# Altium footprint library ST封装.PcbLib: 1336 footprints (part 83 of 109) (continued)
## SQFP20X28-184(T) [mm]
pads (184):
  rect 0.4x1.6 smd: 1(0,0)
  oval 0.4x1.6 smd: 2(-0.5,0) 3(-1,0) 4(-1.5,0) 5(-2,0) 6(-2.5,0) 7(-3,0) 8(-3.5,0) 9(-4,0) 10(-4.5,0) 11(-5,0) 12(-5.5,0) 13(-6,0) 14(-6.5,0) 15(-7,0) 16(-7.5,0) 17(-8,0) 18(-8.5,0) 19(-9,0) 74(-9,-29.4) 75(-8.5,-29.4) 76(-8,-29.4) 77(-7.5,-29.4) 78(-7,-29.4) 79(-6.5,-29.4) 80(-6,-29.4) 81(-5.5,-29.4) 82(-5,-29.4) 83(-4.5,-29.4) 84(-4,-29.4) 85(-3.5,-29.4) 86(-3,-29.4) 87(-2.5,-29.4) 88(-2,-29.4) 89(-1.5,-29.4) 90(-1,-29.4) 91(-0.5,-29.4) 92(0,-29.4) 93(0.5,-29.4) 94(1,-29.4) 95(1.5,-29.4) 96(2,-29.4) 97(2.5,-29.4) 98(3,-29.4) 99(3.5,-29.4) 100(4,-29.4) 101(4.5,-29.4) 102(5,-29.4) 103(5.5,-29.4) 104(6,-29.4) 105(6.5,-29.4) 106(7,-29.4) 107(7.5,-29.4) 108(8,-29.4) 109(8.5,-29.4) 110(9,-29.4) 111(9.5,-29.4) 166(9.5,0) 167(9,0) 168(8.5,0) 169(8,0) 170(7.5,0) 171(7,0) 172(6.5,0) 173(6,0) 174(5.5,0) 175(5,0) 176(4.5,0) 177(4,0) 178(3.5,0) 179(3,0) 180(2.5,0) 181(2,0) 182(1.5,0) 183(1,0) 184(0.5,0)
  oval 1.6x0.4 smd: 20(-10.45,-1.45) 21(-10.45,-1.95) 22(-10.45,-2.45) 23(-10.45,-2.95) 24(-10.45,-3.45) 25(-10.45,-3.95) 26(-10.45,-4.45) 27(-10.45,-4.95) 28(-10.45,-5.45) 29(-10.45,-5.95) 30(-10.45,-6.45) 31(-10.45,-6.95) 32(-10.45,-7.45) 33(-10.45,-7.95) 34(-10.45,-8.45) 35(-10.45,-8.95) 36(-10.45,-9.45) 37(-10.45,-9.95) 38(-10.45,-10.45) 39(-10.45,-10.95) 40(-10.45,-11.45) 41(-10.45,-11.95) 42(-10.45,-12.45) 43(-10.45,-12.95) 44(-10.45,-13.45) 45(-10.45,-13.95) 46(-10.45,-14.45) 47(-10.45,-14.95) 48(-10.45,-15.45) 49(-10.45,-15.95) 50(-10.45,-16.45) 51(-10.45,-16.95) 52(-10.45,-17.45) 53(-10.45,-17.95) 54(-10.45,-18.45) 55(-10.45,-18.95) 56(-10.45,-19.45) 57(-10.45,-19.95) 58(-10.45,-20.45) 59(-10.45,-20.95) 60(-10.45,-21.45) 61(-10.45,-21.95) 62(-10.45,-22.45) 63(-10.45,-22.95) 64(-10.45,-23.45) 65(-10.45,-23.95) 66(-10.45,-24.45) 67(-10.45,-24.95) 68(-10.45,-25.45) 69(-10.45,-25.95) 70(-10.45,-26.45) 71(-10.45,-26.95) 72(-10.45,-27.45) 73(-10.45,-27.95) 112(10.95,-27.95) 113(10.95,-27.45) 114(10.95,-26.95) 115(10.95,-26.45) 116(10.95,-25.95) 117(10.95,-25.45) 118(10.95,-24.95) 119(10.95,-24.45) 120(10.95,-23.95) 121(10.95,-23.45) 122(10.95,-22.95) 123(10.95,-22.45) 124(10.95,-21.95) 125(10.95,-21.45) 126(10.95,-20.95) 127(10.95,-20.45) 128(10.95,-19.95) 129(10.95,-19.45) 130(10.95,-18.95) 131(10.95,-18.45) 132(10.95,-17.95) 133(10.95,-17.45) 134(10.95,-16.95) 135(10.95,-16.45) 136(10.95,-15.95) 137(10.95,-15.45) 138(10.95,-14.95) 139(10.95,-14.45) 140(10.95,-13.95) 141(10.95,-13.45) 142(10.95,-12.95) 143(10.95,-12.45) 144(10.95,-11.95) 145(10.95,-11.45) 146(10.95,-10.95) 147(10.95,-10.45) 148(10.95,-9.95) 149(10.95,-9.45) 150(10.95,-8.95) 151(10.95,-8.45) 152(10.95,-7.95) 153(10.95,-7.45) 154(10.95,-6.95) 155(10.95,-6.45) 156(10.95,-5.95) 157(10.95,-5.45) 158(10.95,-4.95) 159(10.95,-4.45) 160(10.95,-3.95) 161(10.95,-3.45) 162(10.95,-2.95) 163(10.95,-2.45) 164(10.95,-1.95) 165(10.95,-1.45)
Top Overlay:
  lines w0.2: -10.85,-28.65 -10.85,-29.8 -9.7,-29.8 ; -10.85,-0.75 -10.85,-0.4 -10.05,0.4 -9.7,0.4 ; 10.2,-29.8 11.35,-29.8 11.35,-28.65 ; 10.2,0.4 11.35,0.4 11.35,-0.75

## SQFP20X28-224(N) [mm]
pads (224):
  rect 1.6x0.3 smd: 1(0,0)
  oval 1.6x0.3 smd: 2(0,-0.4) 3(0,-0.8) 4(0,-1.2) 5(0,-1.6) 6(0,-2) 7(0,-2.4) 8(0,-2.8) 9(0,-3.2) 10(0,-3.6) 11(0,-4) 12(0,-4.4) 13(0,-4.8) 14(0,-5.2) 15(0,-5.6) 16(0,-6) 17(0,-6.4) 18(0,-6.8) 19(0,-7.2) 20(0,-7.6) 21(0,-8) 22(0,-8.4) 23(0,-8.8) 24(0,-9.2) 25(0,-9.6) 26(0,-10) 27(0,-10.4) 28(0,-10.8) 29(0,-11.2) 30(0,-11.6) 31(0,-12) 32(0,-12.4) 33(0,-12.8) 34(0,-13.2) 35(0,-13.6) 36(0,-14) 37(0,-14.4) 38(0,-14.8) 39(0,-15.2) 40(0,-15.6) 41(0,-16) 42(0,-16.4) 43(0,-16.8) 44(0,-17.2) 45(0,-17.6) 46(0,-18) 47(0,-18.4) 48(0,-18.8) 49(0,-19.2) 50(0,-19.6) 51(0,-20) 52(0,-20.4) 53(0,-20.8) 54(0,-21.2) 55(0,-21.6) 56(0,-22) 57(0,-22.4) 58(0,-22.8) 59(0,-23.2) 60(0,-23.6) 61(0,-24) 62(0,-24.4) 63(0,-24.8) 64(0,-25.2) 65(0,-25.6) 66(0,-26) 113(21.4,-26) 114(21.4,-25.6) 115(21.4,-25.2) 116(21.4,-24.8) 117(21.4,-24.4) 118(21.4,-24) 119(21.4,-23.6) 120(21.4,-23.2) 121(21.4,-22.8) 122(21.4,-22.4) 123(21.4,-22) 124(21.4,-21.6) 125(21.4,-21.2) 126(21.4,-20.8) 127(21.4,-20.4) 128(21.4,-20) 129(21.4,-19.6) 130(21.4,-19.2) 131(21.4,-18.8) 132(21.4,-18.4) 133(21.4,-18) 134(21.4,-17.6) 135(21.4,-17.2) 136(21.4,-16.8) 137(21.4,-16.4) 138(21.4,-16) 139(21.4,-15.6) 140(21.4,-15.2) 141(21.4,-14.8) 142(21.4,-14.4) 143(21.4,-14) 144(21.4,-13.6) 145(21.4,-13.2) 146(21.4,-12.8) 147(21.4,-12.4) 148(21.4,-12) 149(21.4,-11.6) 150(21.4,-11.2) 151(21.4,-10.8) 152(21.4,-10.4) 153(21.4,-10) 154(21.4,-9.6) 155(21.4,-9.2) 156(21.4,-8.8) 157(21.4,-8.4) 158(21.4,-8) 159(21.4,-7.6) 160(21.4,-7.2) 161(21.4,-6.8) 162(21.4,-6.4) 163(21.4,-6) 164(21.4,-5.6) 165(21.4,-5.2) 166(21.4,-4.8) 167(21.4,-4.4) 168(21.4,-4) 169(21.4,-3.6) 170(21.4,-3.2) 171(21.4,-2.8) 172(21.4,-2.4) 173(21.4,-2) 174(21.4,-1.6) 175(21.4,-1.2) 176(21.4,-0.8) 177(21.4,-0.4) 178(21.4,0)
  oval 0.3x1.6 smd: 67(1.7,-27.7) 68(2.1,-27.7) 69(2.5,-27.7) 70(2.9,-27.7) 71(3.3,-27.7) 72(3.7,-27.7) 73(4.1,-27.7) 74(4.5,-27.7) 75(4.9,-27.7) 76(5.3,-27.7) 77(5.7,-27.7) 78(6.1,-27.7) 79(6.5,-27.7) 80(6.9,-27.7) 81(7.3,-27.7) 82(7.7,-27.7) 83(8.1,-27.7) 84(8.5,-27.7) 85(8.9,-27.7) 86(9.3,-27.7) 87(9.7,-27.7) 88(10.1,-27.7) 89(10.5,-27.7) 90(10.9,-27.7) 91(11.3,-27.7) 92(11.7,-27.7) 93(12.1,-27.7) 94(12.5,-27.7) 95(12.9,-27.7) 96(13.3,-27.7) 97(13.7,-27.7) 98(14.1,-27.7) 99(14.5,-27.7) 100(14.9,-27.7) 101(15.3,-27.7) 102(15.7,-27.7) 103(16.1,-27.7) 104(16.5,-27.7) 105(16.9,-27.7) 106(17.3,-27.7) 107(17.7,-27.7) 108(18.1,-27.7) 109(18.5,-27.7) 110(18.9,-27.7) 111(19.3,-27.7) 112(19.7,-27.7) 179(19.7,1.7) 180(19.3,1.7) 181(18.9,1.7) 182(18.5,1.7) 183(18.1,1.7) 184(17.7,1.7) 185(17.3,1.7) 186(16.9,1.7) 187(16.5,1.7) 188(16.1,1.7) 189(15.7,1.7) 190(15.3,1.7) 191(14.9,1.7) 192(14.5,1.7) 193(14.1,1.7) 194(13.7,1.7) 195(13.3,1.7) 196(12.9,1.7) 197(12.5,1.7) 198(12.1,1.7) 199(11.7,1.7) 200(11.3,1.7) 201(10.9,1.7) 202(10.5,1.7) 203(10.1,1.7) 204(9.7,1.7) 205(9.3,1.7) 206(8.9,1.7) 207(8.5,1.7) 208(8.1,1.7) 209(7.7,1.7) 210(7.3,1.7) 211(6.9,1.7) 212(6.5,1.7) 213(6.1,1.7) 214(5.7,1.7) 215(5.3,1.7) 216(4.9,1.7) 217(4.5,1.7) 218(4.1,1.7) 219(3.7,1.7) 220(3.3,1.7) 221(2.9,1.7) 222(2.5,1.7) 223(2.1,1.7) 224(1.7,1.7)
Top Overlay:
  lines w0.2: -0.4,-26.65 -0.4,-28.1 1.05,-28.1 ; -0.4,0.65 -0.4,1.3 0.4,2.1 1.05,2.1 ; 20.35,-28.1 21.8,-28.1 21.8,-26.65 ; 20.35,2.1 21.8,2.1 21.8,0.65

## SQFP20X28-224(T) [mm]
pads (224):
  rect 0.3x1.6 smd: 1(0,0)
  oval 0.3x1.6 smd: 2(-0.4,0) 3(-0.8,0) 4(-1.2,0) 5(-1.6,0) 6(-2,0) 7(-2.4,0) 8(-2.8,0) 9(-3.2,0) 10(-3.6,0) 11(-4,0) 12(-4.4,0) 13(-4.8,0) 14(-5.2,0) 15(-5.6,0) 16(-6,0) 17(-6.4,0) 18(-6.8,0) 19(-7.2,0) 20(-7.6,0) 21(-8,0) 22(-8.4,0) 23(-8.8,0) 90(-8.8,-29.4) 91(-8.4,-29.4) 92(-8,-29.4) 93(-7.6,-29.4) 94(-7.2,-29.4) 95(-6.8,-29.4) 96(-6.4,-29.4) 97(-6,-29.4) 98(-5.6,-29.4) 99(-5.2,-29.4) 100(-4.8,-29.4) 101(-4.4,-29.4) 102(-4,-29.4) 103(-3.6,-29.4) 104(-3.2,-29.4) 105(-2.8,-29.4) 106(-2.4,-29.4) 107(-2,-29.4) 108(-1.6,-29.4) 109(-1.2,-29.4) 110(-0.8,-29.4) 111(-0.4,-29.4) 112(0,-29.4) 113(0.4,-29.4) 114(0.8,-29.4) 115(1.2,-29.4) 116(1.6,-29.4) 117(2,-29.4) 118(2.4,-29.4) 119(2.8,-29.4) 120(3.2,-29.4) 121(3.6,-29.4) 122(4,-29.4) 123(4.4,-29.4) 124(4.8,-29.4) 125(5.2,-29.4) 126(5.6,-29.4) 127(6,-29.4) 128(6.4,-29.4) 129(6.8,-29.4) 130(7.2,-29.4) 131(7.6,-29.4) 132(8,-29.4) 133(8.4,-29.4) 134(8.8,-29.4) 135(9.2,-29.4) 202(9.2,0) 203(8.8,0) 204(8.4,0) 205(8,0) 206(7.6,0) 207(7.2,0) 208(6.8,0) 209(6.4,0) 210(6,0) 211(5.6,0) 212(5.2,0) 213(4.8,0) 214(4.4,0) 215(4,0) 216(3.6,0) 217(3.2,0) 218(2.8,0) 219(2.4,0) 220(2,0) 221(1.6,0) 222(1.2,0) 223(0.8,0) 224(0.4,0)
  oval 1.6x0.3 smd: 24(-10.5,-1.7) 25(-10.5,-2.1) 26(-10.5,-2.5) 27(-10.5,-2.9) 28(-10.5,-3.3) 29(-10.5,-3.7) 30(-10.5,-4.1) 31(-10.5,-4.5) 32(-10.5,-4.9) 33(-10.5,-5.3) 34(-10.5,-5.7) 35(-10.5,-6.1) 36(-10.5,-6.5) 37(-10.5,-6.9) 38(-10.5,-7.3) 39(-10.5,-7.7) 40(-10.5,-8.1) 41(-10.5,-8.5) 42(-10.5,-8.9) 43(-10.5,-9.3) 44(-10.5,-9.7) 45(-10.5,-10.1) 46(-10.5,-10.5) 47(-10.5,-10.9) 48(-10.5,-11.3) 49(-10.5,-11.7) 50(-10.5,-12.1) 51(-10.5,-12.5) 52(-10.5,-12.9) 53(-10.5,-13.3) 54(-10.5,-13.7) 55(-10.5,-14.1) 56(-10.5,-14.5) 57(-10.5,-14.9) 58(-10.5,-15.3) 59(-10.5,-15.7) 60(-10.5,-16.1) 61(-10.5,-16.5) 62(-10.5,-16.9) 63(-10.5,-17.3) 64(-10.5,-17.7) 65(-10.5,-18.1) 66(-10.5,-18.5) 67(-10.5,-18.9) 68(-10.5,-19.3) 69(-10.5,-19.7) 70(-10.5,-20.1) 71(-10.5,-20.5) 72(-10.5,-20.9) 73(-10.5,-21.3) 74(-10.5,-21.7) 75(-10.5,-22.1) 76(-10.5,-22.5) 77(-10.5,-22.9) 78(-10.5,-23.3) 79(-10.5,-23.7) 80(-10.5,-24.1) 81(-10.5,-24.5) 82(-10.5,-24.9) 83(-10.5,-25.3) 84(-10.5,-25.7) 85(-10.5,-26.1) 86(-10.5,-26.5) 87(-10.5,-26.9) 88(-10.5,-27.3) 89(-10.5,-27.7) 136(10.9,-27.7) 137(10.9,-27.3) 138(10.9,-26.9) 139(10.9,-26.5) 140(10.9,-26.1) 141(10.9,-25.7) 142(10.9,-25.3) 143(10.9,-24.9) 144(10.9,-24.5) 145(10.9,-24.1) 146(10.9,-23.7) 147(10.9,-23.3) 148(10.9,-22.9) 149(10.9,-22.5) 150(10.9,-22.1) 151(10.9,-21.7) 152(10.9,-21.3) 153(10.9,-20.9) 154(10.9,-20.5) 155(10.9,-20.1) 156(10.9,-19.7) 157(10.9,-19.3) 158(10.9,-18.9) 159(10.9,-18.5) 160(10.9,-18.1) 161(10.9,-17.7) 162(10.9,-17.3) 163(10.9,-16.9) 164(10.9,-16.5) 165(10.9,-16.1) 166(10.9,-15.7) 167(10.9,-15.3) 168(10.9,-14.9) 169(10.9,-14.5) 170(10.9,-14.1) 171(10.9,-13.7) 172(10.9,-13.3) 173(10.9,-12.9) 174(10.9,-12.5) 175(10.9,-12.1) 176(10.9,-11.7) 177(10.9,-11.3) 178(10.9,-10.9) 179(10.9,-10.5) 180(10.9,-10.1) 181(10.9,-9.7) 182(10.9,-9.3) 183(10.9,-8.9) 184(10.9,-8.5) 185(10.9,-8.1) 186(10.9,-7.7) 187(10.9,-7.3) 188(10.9,-6.9) 189(10.9,-6.5) 190(10.9,-6.1) 191(10.9,-5.7) 192(10.9,-5.3) 193(10.9,-4.9) 194(10.9,-4.5) 195(10.9,-4.1) 196(10.9,-3.7) 197(10.9,-3.3) 198(10.9,-2.9) 199(10.9,-2.5) 200(10.9,-2.1) 201(10.9,-1.7)
Top Overlay:
  lines w0.2: -10.9,-28.35 -10.9,-29.8 -9.45,-29.8 ; -10.9,-1.05 -10.9,-0.4 -10.1,0.4 -9.45,0.4 ; 9.85,-29.8 11.3,-29.8 11.3,-28.35 ; 9.85,0.4 11.3,0.4 11.3,-1.05

## SQFP20X28-232(N) [mm]
pads (232):
  rect 1.6x0.3 smd: 1(0,0)
  oval 1.6x0.3 smd: 2(0,-0.4) 3(0,-0.8) 4(0,-1.2) 5(0,-1.6) 6(0,-2) 7(0,-2.4) 8(0,-2.8) 9(0,-3.2) 10(0,-3.6) 11(0,-4) 12(0,-4.4) 13(0,-4.8) 14(0,-5.2) 15(0,-5.6) 16(0,-6) 17(0,-6.4) 18(0,-6.8) 19(0,-7.2) 20(0,-7.6) 21(0,-8) 22(0,-8.4) 23(0,-8.8) 24(0,-9.2) 25(0,-9.6) 26(0,-10) 27(0,-10.4) 28(0,-10.8) 29(0,-11.2) 30(0,-11.6) 31(0,-12) 32(0,-12.4) 33(0,-12.8) 34(0,-13.2) 35(0,-13.6) 36(0,-14) 37(0,-14.4) 38(0,-14.8) 39(0,-15.2) 40(0,-15.6) 41(0,-16) 42(0,-16.4) 43(0,-16.8) 44(0,-17.2) 45(0,-17.6) 46(0,-18) 47(0,-18.4) 48(0,-18.8) 49(0,-19.2) 50(0,-19.6) 51(0,-20) 52(0,-20.4) 53(0,-20.8) 54(0,-21.2) 55(0,-21.6) 56(0,-22) 57(0,-22.4) 58(0,-22.8) 59(0,-23.2) 60(0,-23.6) 61(0,-24) 62(0,-24.4) 63(0,-24.8) 64(0,-25.2) 65(0,-25.6) 66(0,-26) 67(0,-26.4) 68(0,-26.8) 117(21.4,-26.8) 118(21.4,-26.4) 119(21.4,-26) 120(21.4,-25.6) 121(21.4,-25.2) 122(21.4,-24.8) 123(21.4,-24.4) 124(21.4,-24) 125(21.4,-23.6) 126(21.4,-23.2) 127(21.4,-22.8) 128(21.4,-22.4) 129(21.4,-22) 130(21.4,-21.6) 131(21.4,-21.2) 132(21.4,-20.8) 133(21.4,-20.4) 134(21.4,-20) 135(21.4,-19.6) 136(21.4,-19.2) 137(21.4,-18.8) 138(21.4,-18.4) 139(21.4,-18) 140(21.4,-17.6) 141(21.4,-17.2) 142(21.4,-16.8) 143(21.4,-16.4) 144(21.4,-16) 145(21.4,-15.6) 146(21.4,-15.2) 147(21.4,-14.8) 148(21.4,-14.4) 149(21.4,-14) 150(21.4,-13.6) 151(21.4,-13.2) 152(21.4,-12.8) 153(21.4,-12.4) 154(21.4,-12) 155(21.4,-11.6) 156(21.4,-11.2) 157(21.4,-10.8) 158(21.4,-10.4) 159(21.4,-10) 160(21.4,-9.6) 161(21.4,-9.2) 162(21.4,-8.8) 163(21.4,-8.4) 164(21.4,-8) 165(21.4,-7.6) 166(21.4,-7.2) 167(21.4,-6.8) 168(21.4,-6.4) 169(21.4,-6) 170(21.4,-5.6) 171(21.4,-5.2) 172(21.4,-4.8) 173(21.4,-4.4) 174(21.4,-4) 175(21.4,-3.6) 176(21.4,-3.2) 177(21.4,-2.8) 178(21.4,-2.4) 179(21.4,-2) 180(21.4,-1.6) 181(21.4,-1.2) 182(21.4,-0.8) 183(21.4,-0.4) 184(21.4,0)
  oval 0.3x1.6 smd: 69(1.3,-28.1) 70(1.7,-28.1) 71(2.1,-28.1) 72(2.5,-28.1) 73(2.9,-28.1) 74(3.3,-28.1) 75(3.7,-28.1) 76(4.1,-28.1) 77(4.5,-28.1) 78(4.9,-28.1) 79(5.3,-28.1) 80(5.7,-28.1) 81(6.1,-28.1) 82(6.5,-28.1) 83(6.9,-28.1) 84(7.3,-28.1) 85(7.7,-28.1) 86(8.1,-28.1) 87(8.5,-28.1) 88(8.9,-28.1) 89(9.3,-28.1) 90(9.7,-28.1) 91(10.1,-28.1) 92(10.5,-28.1) 93(10.9,-28.1) 94(11.3,-28.1) 95(11.7,-28.1) 96(12.1,-28.1) 97(12.5,-28.1) 98(12.9,-28.1) 99(13.3,-28.1) 100(13.7,-28.1) 101(14.1,-28.1) 102(14.5,-28.1) 103(14.9,-28.1) 104(15.3,-28.1) 105(15.7,-28.1) 106(16.1,-28.1) 107(16.5,-28.1) 108(16.9,-28.1) 109(17.3,-28.1) 110(17.7,-28.1) 111(18.1,-28.1) 112(18.5,-28.1) 113(18.9,-28.1) 114(19.3,-28.1) 115(19.7,-28.1) 116(20.1,-28.1) 185(20.1,1.3) 186(19.7,1.3) 187(19.3,1.3) 188(18.9,1.3) 189(18.5,1.3) 190(18.1,1.3) 191(17.7,1.3) 192(17.3,1.3) 193(16.9,1.3) 194(16.5,1.3) 195(16.1,1.3) 196(15.7,1.3) 197(15.3,1.3) 198(14.9,1.3) 199(14.5,1.3) 200(14.1,1.3) 201(13.7,1.3) 202(13.3,1.3) 203(12.9,1.3) 204(12.5,1.3) 205(12.1,1.3) 206(11.7,1.3) 207(11.3,1.3) 208(10.9,1.3) 209(10.5,1.3) 210(10.1,1.3) 211(9.7,1.3) 212(9.3,1.3) 213(8.9,1.3) 214(8.5,1.3) 215(8.1,1.3) 216(7.7,1.3) 217(7.3,1.3) 218(6.9,1.3) 219(6.5,1.3) 220(6.1,1.3) 221(5.7,1.3) 222(5.3,1.3) 223(4.9,1.3) 224(4.5,1.3) 225(4.1,1.3) 226(3.7,1.3) 227(3.3,1.3) 228(2.9,1.3) 229(2.5,1.3) 230(2.1,1.3) 231(1.7,1.3) 232(1.3,1.3)
Top Overlay:
  lines w0.2: -0.4,-27.45 -0.4,-28.5 0.65,-28.5 ; -0.4,0.65 -0.4,0.9 0.4,1.7 0.65,1.7 ; 20.75,-28.5 21.8,-28.5 21.8,-27.45 ; 20.75,1.7 21.8,1.7 21.8,0.65

## SQFP20X28-232(T) [mm]
pads (232):
  rect 0.3x1.6 smd: 1(0,0)
  oval 0.3x1.6 smd: 2(-0.4,0) 3(-0.8,0) 4(-1.2,0) 5(-1.6,0) 6(-2,0) 7(-2.4,0) 8(-2.8,0) 9(-3.2,0) 10(-3.6,0) 11(-4,0) 12(-4.4,0) 13(-4.8,0) 14(-5.2,0) 15(-5.6,0) 16(-6,0) 17(-6.4,0) 18(-6.8,0) 19(-7.2,0) 20(-7.6,0) 21(-8,0) 22(-8.4,0) 23(-8.8,0) 24(-9.2,0) 93(-9.2,-29.4) 94(-8.8,-29.4) 95(-8.4,-29.4) 96(-8,-29.4) 97(-7.6,-29.4) 98(-7.2,-29.4) 99(-6.8,-29.4) 100(-6.4,-29.4) 101(-6,-29.4) 102(-5.6,-29.4) 103(-5.2,-29.4) 104(-4.8,-29.4) 105(-4.4,-29.4) 106(-4,-29.4) 107(-3.6,-29.4) 108(-3.2,-29.4) 109(-2.8,-29.4) 110(-2.4,-29.4) 111(-2,-29.4) 112(-1.6,-29.4) 113(-1.2,-29.4) 114(-0.8,-29.4) 115(-0.4,-29.4) 116(0,-29.4) 117(0.4,-29.4) 118(0.8,-29.4) 119(1.2,-29.4) 120(1.6,-29.4) 121(2,-29.4) 122(2.4,-29.4) 123(2.8,-29.4) 124(3.2,-29.4) 125(3.6,-29.4) 126(4,-29.4) 127(4.4,-29.4) 128(4.8,-29.4) 129(5.2,-29.4) 130(5.6,-29.4) 131(6,-29.4) 132(6.4,-29.4) 133(6.8,-29.4) 134(7.2,-29.4) 135(7.6,-29.4) 136(8,-29.4) 137(8.4,-29.4) 138(8.8,-29.4) 139(9.2,-29.4) 140(9.6,-29.4) 209(9.6,0) 210(9.2,0) 211(8.8,0) 212(8.4,0) 213(8,0) 214(7.6,0) 215(7.2,0) 216(6.8,0) 217(6.4,0) 218(6,0) 219(5.6,0) 220(5.2,0) 221(4.8,0) 222(4.4,0) 223(4,0) 224(3.6,0) 225(3.2,0) 226(2.8,0) 227(2.4,0) 228(2,0) 229(1.6,0) 230(1.2,0) 231(0.8,0) 232(0.4,0)
  oval 1.6x0.3 smd: 25(-10.5,-1.3) 26(-10.5,-1.7) 27(-10.5,-2.1) 28(-10.5,-2.5) 29(-10.5,-2.9) 30(-10.5,-3.3) 31(-10.5,-3.7) 32(-10.5,-4.1) 33(-10.5,-4.5) 34(-10.5,-4.9) 35(-10.5,-5.3) 36(-10.5,-5.7) 37(-10.5,-6.1) 38(-10.5,-6.5) 39(-10.5,-6.9) 40(-10.5,-7.3) 41(-10.5,-7.7) 42(-10.5,-8.1) 43(-10.5,-8.5) 44(-10.5,-8.9) 45(-10.5,-9.3) 46(-10.5,-9.7) 47(-10.5,-10.1) 48(-10.5,-10.5) 49(-10.5,-10.9) 50(-10.5,-11.3) 51(-10.5,-11.7) 52(-10.5,-12.1) 53(-10.5,-12.5) 54(-10.5,-12.9) 55(-10.5,-13.3) 56(-10.5,-13.7) 57(-10.5,-14.1) 58(-10.5,-14.5) 59(-10.5,-14.9) 60(-10.5,-15.3) 61(-10.5,-15.7) 62(-10.5,-16.1) 63(-10.5,-16.5) 64(-10.5,-16.9) 65(-10.5,-17.3) 66(-10.5,-17.7) 67(-10.5,-18.1) 68(-10.5,-18.5) 69(-10.5,-18.9) 70(-10.5,-19.3) 71(-10.5,-19.7) 72(-10.5,-20.1) 73(-10.5,-20.5) 74(-10.5,-20.9) 75(-10.5,-21.3) 76(-10.5,-21.7) 77(-10.5,-22.1) 78(-10.5,-22.5) 79(-10.5,-22.9) 80(-10.5,-23.3) 81(-10.5,-23.7) 82(-10.5,-24.1) 83(-10.5,-24.5) 84(-10.5,-24.9) 85(-10.5,-25.3) 86(-10.5,-25.7) 87(-10.5,-26.1) 88(-10.5,-26.5) 89(-10.5,-26.9) 90(-10.5,-27.3) 91(-10.5,-27.7) 92(-10.5,-28.1) 141(10.9,-28.1) 142(10.9,-27.7) 143(10.9,-27.3) 144(10.9,-26.9) 145(10.9,-26.5) 146(10.9,-26.1) 147(10.9,-25.7) 148(10.9,-25.3) 149(10.9,-24.9) 150(10.9,-24.5) 151(10.9,-24.1) 152(10.9,-23.7) 153(10.9,-23.3) 154(10.9,-22.9) 155(10.9,-22.5) 156(10.9,-22.1) 157(10.9,-21.7) 158(10.9,-21.3) 159(10.9,-20.9) 160(10.9,-20.5) 161(10.9,-20.1) 162(10.9,-19.7) 163(10.9,-19.3) 164(10.9,-18.9) 165(10.9,-18.5) 166(10.9,-18.1) 167(10.9,-17.7) 168(10.9,-17.3) 169(10.9,-16.9) 170(10.9,-16.5) 171(10.9,-16.1) 172(10.9,-15.7) 173(10.9,-15.3) 174(10.9,-14.9) 175(10.9,-14.5) 176(10.9,-14.1) 177(10.9,-13.7) 178(10.9,-13.3) 179(10.9,-12.9) 180(10.9,-12.5) 181(10.9,-12.1) 182(10.9,-11.7) 183(10.9,-11.3) 184(10.9,-10.9) 185(10.9,-10.5) 186(10.9,-10.1) 187(10.9,-9.7) 188(10.9,-9.3) 189(10.9,-8.9) 190(10.9,-8.5) 191(10.9,-8.1) 192(10.9,-7.7) 193(10.9,-7.3) 194(10.9,-6.9) 195(10.9,-6.5) 196(10.9,-6.1) 197(10.9,-5.7) 198(10.9,-5.3) 199(10.9,-4.9) 200(10.9,-4.5) 201(10.9,-4.1) 202(10.9,-3.7) 203(10.9,-3.3) 204(10.9,-2.9) 205(10.9,-2.5) 206(10.9,-2.1) 207(10.9,-1.7) 208(10.9,-1.3)
Top Overlay:
  lines w0.2: -10.9,-28.75 -10.9,-29.8 -9.85,-29.8 ; -10.9,-0.65 -10.9,-0.4 -10.1,0.4 -9.85,0.4 ; 10.25,-29.8 11.3,-29.8 11.3,-28.75 ; 10.25,0.4 11.3,0.4 11.3,-0.65

## SQFP20X28-300(N) [mm]
pads (300):
  rect 1.6x0.2 smd: 1(0,0)
  oval 1.6x0.2 smd: 2(0,-0.3) 3(0,-0.6) 4(0,-0.9) 5(0,-1.2) 6(0,-1.5) 7(0,-1.8) 8(0,-2.1) 9(0,-2.4) 10(0,-2.7) 11(0,-3) 12(0,-3.3) 13(0,-3.6) 14(0,-3.9) 15(0,-4.2) 16(0,-4.5) 17(0,-4.8) 18(0,-5.1) 19(0,-5.4) 20(0,-5.7) 21(0,-6) 22(0,-6.3) 23(0,-6.6) 24(0,-6.9) 25(0,-7.2) 26(0,-7.5) 27(0,-7.8) 28(0,-8.1) 29(0,-8.4) 30(0,-8.7) 31(0,-9) 32(0,-9.3) 33(0,-9.6) 34(0,-9.9) 35(0,-10.2) 36(0,-10.5) 37(0,-10.8) 38(0,-11.1) 39(0,-11.4) 40(0,-11.7) 41(0,-12) 42(0,-12.3) 43(0,-12.6) 44(0,-12.9) 45(0,-13.2) 46(0,-13.5) 47(0,-13.8) 48(0,-14.1) 49(0,-14.4) 50(0,-14.7) 51(0,-15) 52(0,-15.3) 53(0,-15.6) 54(0,-15.9) 55(0,-16.2) 56(0,-16.5) 57(0,-16.8) 58(0,-17.1) 59(0,-17.4) 60(0,-17.7) 61(0,-18) 62(0,-18.3) 63(0,-18.6) 64(0,-18.9) 65(0,-19.2) 66(0,-19.5) 67(0,-19.8) 68(0,-20.1) 69(0,-20.4) 70(0,-20.7) 71(0,-21) 72(0,-21.3) 73(0,-21.6) 74(0,-21.9) 75(0,-22.2) 76(0,-22.5) 77(0,-22.8) 78(0,-23.1) 79(0,-23.4) 80(0,-23.7) 81(0,-24) 82(0,-24.3) 83(0,-24.6) 84(0,-24.9) 85(0,-25.2) 86(0,-25.5) 87(0,-25.8) 88(0,-26.1) 151(21.4,-26.1) 152(21.4,-25.8) 153(21.4,-25.5) 154(21.4,-25.2) 155(21.4,-24.9) 156(21.4,-24.6) 157(21.4,-24.3) 158(21.4,-24) 159(21.4,-23.7) 160(21.4,-23.4) 161(21.4,-23.1) 162(21.4,-22.8) 163(21.4,-22.5) 164(21.4,-22.2) 165(21.4,-21.9) 166(21.4,-21.6) 167(21.4,-21.3) 168(21.4,-21) 169(21.4,-20.7) 170(21.4,-20.4) 171(21.4,-20.1) 172(21.4,-19.8) 173(21.4,-19.5) 174(21.4,-19.2) 175(21.4,-18.9) 176(21.4,-18.6) 177(21.4,-18.3) 178(21.4,-18) 179(21.4,-17.7) 180(21.4,-17.4) 181(21.4,-17.1) 182(21.4,-16.8) 183(21.4,-16.5) 184(21.4,-16.2) 185(21.4,-15.9) 186(21.4,-15.6) 187(21.4,-15.3) 188(21.4,-15) 189(21.4,-14.7) 190(21.4,-14.4) 191(21.4,-14.1) 192(21.4,-13.8) 193(21.4,-13.5) 194(21.4,-13.2) 195(21.4,-12.9) 196(21.4,-12.6) 197(21.4,-12.3) 198(21.4,-12) 199(21.4,-11.7) 200(21.4,-11.4) 201(21.4,-11.1) 202(21.4,-10.8) 203(21.4,-10.5) 204(21.4,-10.2) 205(21.4,-9.9) 206(21.4,-9.6) 207(21.4,-9.3) 208(21.4,-9) 209(21.4,-8.7) 210(21.4,-8.4) 211(21.4,-8.1) 212(21.4,-7.8) 213(21.4,-7.5) 214(21.4,-7.2) 215(21.4,-6.9) 216(21.4,-6.6) 217(21.4,-6.3) 218(21.4,-6) 219(21.4,-5.7) 220(21.4,-5.4) 221(21.4,-5.1) 222(21.4,-4.8) 223(21.4,-4.5) 224(21.4,-4.2) 225(21.4,-3.9) 226(21.4,-3.6) 227(21.4,-3.3) 228(21.4,-3) 229(21.4,-2.7) 230(21.4,-2.4) 231(21.4,-2.1) 232(21.4,-1.8) 233(21.4,-1.5) 234(21.4,-1.2) 235(21.4,-0.9) 236(21.4,-0.6) 237(21.4,-0.3) 238(21.4,0)
  oval 0.2x1.6 smd: 89(1.55,-27.75) 90(1.85,-27.75) 91(2.15,-27.75) 92(2.45,-27.75) 93(2.75,-27.75) 94(3.05,-27.75) 95(3.35,-27.75) 96(3.65,-27.75) 97(3.95,-27.75) 98(4.25,-27.75) 99(4.55,-27.75) 100(4.85,-27.75) 101(5.15,-27.75) 102(5.45,-27.75) 103(5.75,-27.75) 104(6.05,-27.75) 105(6.35,-27.75) 106(6.65,-27.75) 107(6.95,-27.75) 108(7.25,-27.75) 109(7.55,-27.75) 110(7.85,-27.75) 111(8.15,-27.75) 112(8.45,-27.75) 113(8.75,-27.75) 114(9.05,-27.75) 115(9.35,-27.75) 116(9.65,-27.75) 117(9.95,-27.75) 118(10.25,-27.75) 119(10.55,-27.75) 120(10.85,-27.75) 121(11.15,-27.75) 122(11.45,-27.75) 123(11.75,-27.75) 124(12.05,-27.75) 125(12.35,-27.75) 126(12.65,-27.75) 127(12.95,-27.75) 128(13.25,-27.75) 129(13.55,-27.75) 130(13.85,-27.75) 131(14.15,-27.75) 132(14.45,-27.75) 133(14.75,-27.75) 134(15.05,-27.75) 135(15.35,-27.75) 136(15.65,-27.75) 137(15.95,-27.75) 138(16.25,-27.75) 139(16.55,-27.75) 140(16.85,-27.75) 141(17.15,-27.75) 142(17.45,-27.75) 143(17.75,-27.75) 144(18.05,-27.75) 145(18.35,-27.75) 146(18.65,-27.75) 147(18.95,-27.75) 148(19.25,-27.75) 149(19.55,-27.75) 150(19.85,-27.75) 239(19.85,1.65) 240(19.55,1.65) 241(19.25,1.65) 242(18.95,1.65) 243(18.65,1.65) 244(18.35,1.65) 245(18.05,1.65) 246(17.75,1.65) 247(17.45,1.65) 248(17.15,1.65) 249(16.85,1.65) 250(16.55,1.65) 251(16.25,1.65) 252(15.95,1.65) 253(15.65,1.65) 254(15.35,1.65) 255(15.05,1.65) 256(14.75,1.65) 257(14.45,1.65) 258(14.15,1.65) 259(13.85,1.65) 260(13.55,1.65) 261(13.25,1.65) 262(12.95,1.65) 263(12.65,1.65) 264(12.35,1.65) 265(12.05,1.65) 266(11.75,1.65) 267(11.45,1.65) 268(11.15,1.65) 269(10.85,1.65) 270(10.55,1.65) 271(10.25,1.65) 272(9.95,1.65) 273(9.65,1.65) 274(9.35,1.65) 275(9.05,1.65) 276(8.75,1.65) 277(8.45,1.65) 278(8.15,1.65) 279(7.85,1.65) 280(7.55,1.65) 281(7.25,1.65) 282(6.95,1.65) 283(6.65,1.65) 284(6.35,1.65) 285(6.05,1.65) 286(5.75,1.65) 287(5.45,1.65) 288(5.15,1.65) 289(4.85,1.65) 290(4.55,1.65) 291(4.25,1.65) 292(3.95,1.65) 293(3.65,1.65) 294(3.35,1.65) 295(3.05,1.65) 296(2.75,1.65) 297(2.45,1.65) 298(2.15,1.65) 299(1.85,1.65) 300(1.55,1.65)
Top Overlay:
  lines w0.2: -0.4,-26.7 -0.4,-28.15 0.95,-28.15 ; -0.4,0.6 -0.4,1.25 0.4,2.05 0.95,2.05 ; 20.45,-28.15 21.8,-28.15 21.8,-26.7 ; 20.45,2.05 21.8,2.05 21.8,0.6

## SQFP20X28-300(T) [mm]
pads (300):
  rect 0.2x1.6 smd: 1(0,0)
  oval 0.2x1.6 smd: 2(-0.3,0) 3(-0.6,0) 4(-0.9,0) 5(-1.2,0) 6(-1.5,0) 7(-1.8,0) 8(-2.1,0) 9(-2.4,0) 10(-2.7,0) 11(-3,0) 12(-3.3,0) 13(-3.6,0) 14(-3.9,0) 15(-4.2,0) 16(-4.5,0) 17(-4.8,0) 18(-5.1,0) 19(-5.4,0) 20(-5.7,0) 21(-6,0) 22(-6.3,0) 23(-6.6,0) 24(-6.9,0) 25(-7.2,0) 26(-7.5,0) 27(-7.8,0) 28(-8.1,0) 29(-8.4,0) 30(-8.7,0) 31(-9,0) 120(-9,-29.4) 121(-8.7,-29.4) 122(-8.4,-29.4) 123(-8.1,-29.4) 124(-7.8,-29.4) 125(-7.5,-29.4) 126(-7.2,-29.4) 127(-6.9,-29.4) 128(-6.6,-29.4) 129(-6.3,-29.4) 130(-6,-29.4) 131(-5.7,-29.4) 132(-5.4,-29.4) 133(-5.1,-29.4) 134(-4.8,-29.4) 135(-4.5,-29.4) 136(-4.2,-29.4) 137(-3.9,-29.4) 138(-3.6,-29.4) 139(-3.3,-29.4) 140(-3,-29.4) 141(-2.7,-29.4) 142(-2.4,-29.4) 143(-2.1,-29.4) 144(-1.8,-29.4) 145(-1.5,-29.4) 146(-1.2,-29.4) 147(-0.9,-29.4) 148(-0.6,-29.4) 149(-0.3,-29.4) 150(0,-29.4) 151(0.3,-29.4) 152(0.6,-29.4) 153(0.9,-29.4) 154(1.2,-29.4) 155(1.5,-29.4) 156(1.8,-29.4) 157(2.1,-29.4) 158(2.4,-29.4) 159(2.7,-29.4) 160(3,-29.4) 161(3.3,-29.4) 162(3.6,-29.4) 163(3.9,-29.4) 164(4.2,-29.4) 165(4.5,-29.4) 166(4.8,-29.4) 167(5.1,-29.4) 168(5.4,-29.4) 169(5.7,-29.4) 170(6,-29.4) 171(6.3,-29.4) 172(6.6,-29.4) 173(6.9,-29.4) 174(7.2,-29.4) 175(7.5,-29.4) 176(7.8,-29.4) 177(8.1,-29.4) 178(8.4,-29.4) 179(8.7,-29.4) 180(9,-29.4) 181(9.3,-29.4) 270(9.3,0) 271(9,0) 272(8.7,0) 273(8.4,0) 274(8.1,0) 275(7.8,0) 276(7.5,0) 277(7.2,0) 278(6.9,0) 279(6.6,0) 280(6.3,0) 281(6,0) 282(5.7,0) 283(5.4,0) 284(5.1,0) 285(4.8,0) 286(4.5,0) 287(4.2,0) 288(3.9,0) 289(3.6,0) 290(3.3,0) 291(3,0) 292(2.7,0) 293(2.4,0) 294(2.1,0) 295(1.8,0) 296(1.5,0) 297(1.2,0) 298(0.9,0) 299(0.6,0) 300(0.3,0)
  oval 1.6x0.2 smd: 32(-10.55,-1.65) 33(-10.55,-1.95) 34(-10.55,-2.25) 35(-10.55,-2.55) 36(-10.55,-2.85) 37(-10.55,-3.15) 38(-10.55,-3.45) 39(-10.55,-3.75) 40(-10.55,-4.05) 41(-10.55,-4.35) 42(-10.55,-4.65) 43(-10.55,-4.95) 44(-10.55,-5.25) 45(-10.55,-5.55) 46(-10.55,-5.85) 47(-10.55,-6.15) 48(-10.55,-6.45) 49(-10.55,-6.75) 50(-10.55,-7.05) 51(-10.55,-7.35) 52(-10.55,-7.65) 53(-10.55,-7.95) 54(-10.55,-8.25) 55(-10.55,-8.55) 56(-10.55,-8.85) 57(-10.55,-9.15) 58(-10.55,-9.45) 59(-10.55,-9.75) 60(-10.55,-10.05) 61(-10.55,-10.35) 62(-10.55,-10.65) 63(-10.55,-10.95) 64(-10.55,-11.25) 65(-10.55,-11.55) 66(-10.55,-11.85) 67(-10.55,-12.15) 68(-10.55,-12.45) 69(-10.55,-12.75) 70(-10.55,-13.05) 71(-10.55,-13.35) 72(-10.55,-13.65) 73(-10.55,-13.95) 74(-10.55,-14.25) 75(-10.55,-14.55) 76(-10.55,-14.85) 77(-10.55,-15.15) 78(-10.55,-15.45) 79(-10.55,-15.75) 80(-10.55,-16.05) 81(-10.55,-16.35) 82(-10.55,-16.65) 83(-10.55,-16.95) 84(-10.55,-17.25) 85(-10.55,-17.55) 86(-10.55,-17.85) 87(-10.55,-18.15) 88(-10.55,-18.45) 89(-10.55,-18.75) 90(-10.55,-19.05) 91(-10.55,-19.35) 92(-10.55,-19.65) 93(-10.55,-19.95) 94(-10.55,-20.25) 95(-10.55,-20.55) 96(-10.55,-20.85) 97(-10.55,-21.15) 98(-10.55,-21.45) 99(-10.55,-21.75) 100(-10.55,-22.05) 101(-10.55,-22.35) 102(-10.55,-22.65) 103(-10.55,-22.95) 104(-10.55,-23.25) 105(-10.55,-23.55) 106(-10.55,-23.85) 107(-10.55,-24.15) 108(-10.55,-24.45) 109(-10.55,-24.75) 110(-10.55,-25.05) 111(-10.55,-25.35) 112(-10.55,-25.65) 113(-10.55,-25.95) 114(-10.55,-26.25) 115(-10.55,-26.55) 116(-10.55,-26.85) 117(-10.55,-27.15) 118(-10.55,-27.45) 119(-10.55,-27.75) 182(10.85,-27.75) 183(10.85,-27.45) 184(10.85,-27.15) 185(10.85,-26.85) 186(10.85,-26.55) 187(10.85,-26.25) 188(10.85,-25.95) 189(10.85,-25.65) 190(10.85,-25.35) 191(10.85,-25.05) 192(10.85,-24.75) 193(10.85,-24.45) 194(10.85,-24.15) 195(10.85,-23.85) 196(10.85,-23.55) 197(10.85,-23.25) 198(10.85,-22.95) 199(10.85,-22.65) 200(10.85,-22.35) 201(10.85,-22.05) 202(10.85,-21.75) 203(10.85,-21.45) 204(10.85,-21.15) 205(10.85,-20.85) 206(10.85,-20.55) 207(10.85,-20.25) 208(10.85,-19.95) 209(10.85,-19.65) 210(10.85,-19.35) 211(10.85,-19.05) 212(10.85,-18.75) 213(10.85,-18.45) 214(10.85,-18.15) 215(10.85,-17.85) 216(10.85,-17.55) 217(10.85,-17.25) 218(10.85,-16.95) 219(10.85,-16.65) 220(10.85,-16.35) 221(10.85,-16.05) 222(10.85,-15.75) 223(10.85,-15.45) 224(10.85,-15.15) 225(10.85,-14.85) 226(10.85,-14.55) 227(10.85,-14.25) 228(10.85,-13.95) 229(10.85,-13.65) 230(10.85,-13.35) 231(10.85,-13.05) 232(10.85,-12.75) 233(10.85,-12.45) 234(10.85,-12.15) 235(10.85,-11.85) 236(10.85,-11.55) 237(10.85,-11.25) 238(10.85,-10.95) 239(10.85,-10.65) 240(10.85,-10.35) 241(10.85,-10.05) 242(10.85,-9.75) 243(10.85,-9.45) 244(10.85,-9.15) 245(10.85,-8.85) 246(10.85,-8.55) 247(10.85,-8.25) 248(10.85,-7.95) 249(10.85,-7.65) 250(10.85,-7.35) 251(10.85,-7.05) 252(10.85,-6.75) 253(10.85,-6.45) 254(10.85,-6.15) 255(10.85,-5.85) 256(10.85,-5.55) 257(10.85,-5.25) 258(10.85,-4.95) 259(10.85,-4.65) 260(10.85,-4.35) 261(10.85,-4.05) 262(10.85,-3.75) 263(10.85,-3.45) 264(10.85,-3.15) 265(10.85,-2.85) 266(10.85,-2.55) 267(10.85,-2.25) 268(10.85,-1.95) 269(10.85,-1.65)
Top Overlay:
  lines w0.2: -10.95,-28.35 -10.95,-29.8 -9.6,-29.8 ; -10.95,-1.05 -10.95,-0.4 -10.15,0.4 -9.6,0.4 ; 9.9,-29.8 11.25,-29.8 11.25,-28.35 ; 9.9,0.4 11.25,0.4 11.25,-1.05